# Altium footprint library IC.PcbLib: 386 footprints (part 20 of 30)
Each footprint in its own frame and in the unit in brackets; x right, y up, seen from the top. Pads: shape width x height; smd on the part's side, far side on the other; paste and mask are expansions set on the pad; w line width, h text height; cw(c..) or ccw(c..) is an arc to the next point about the centre after c.
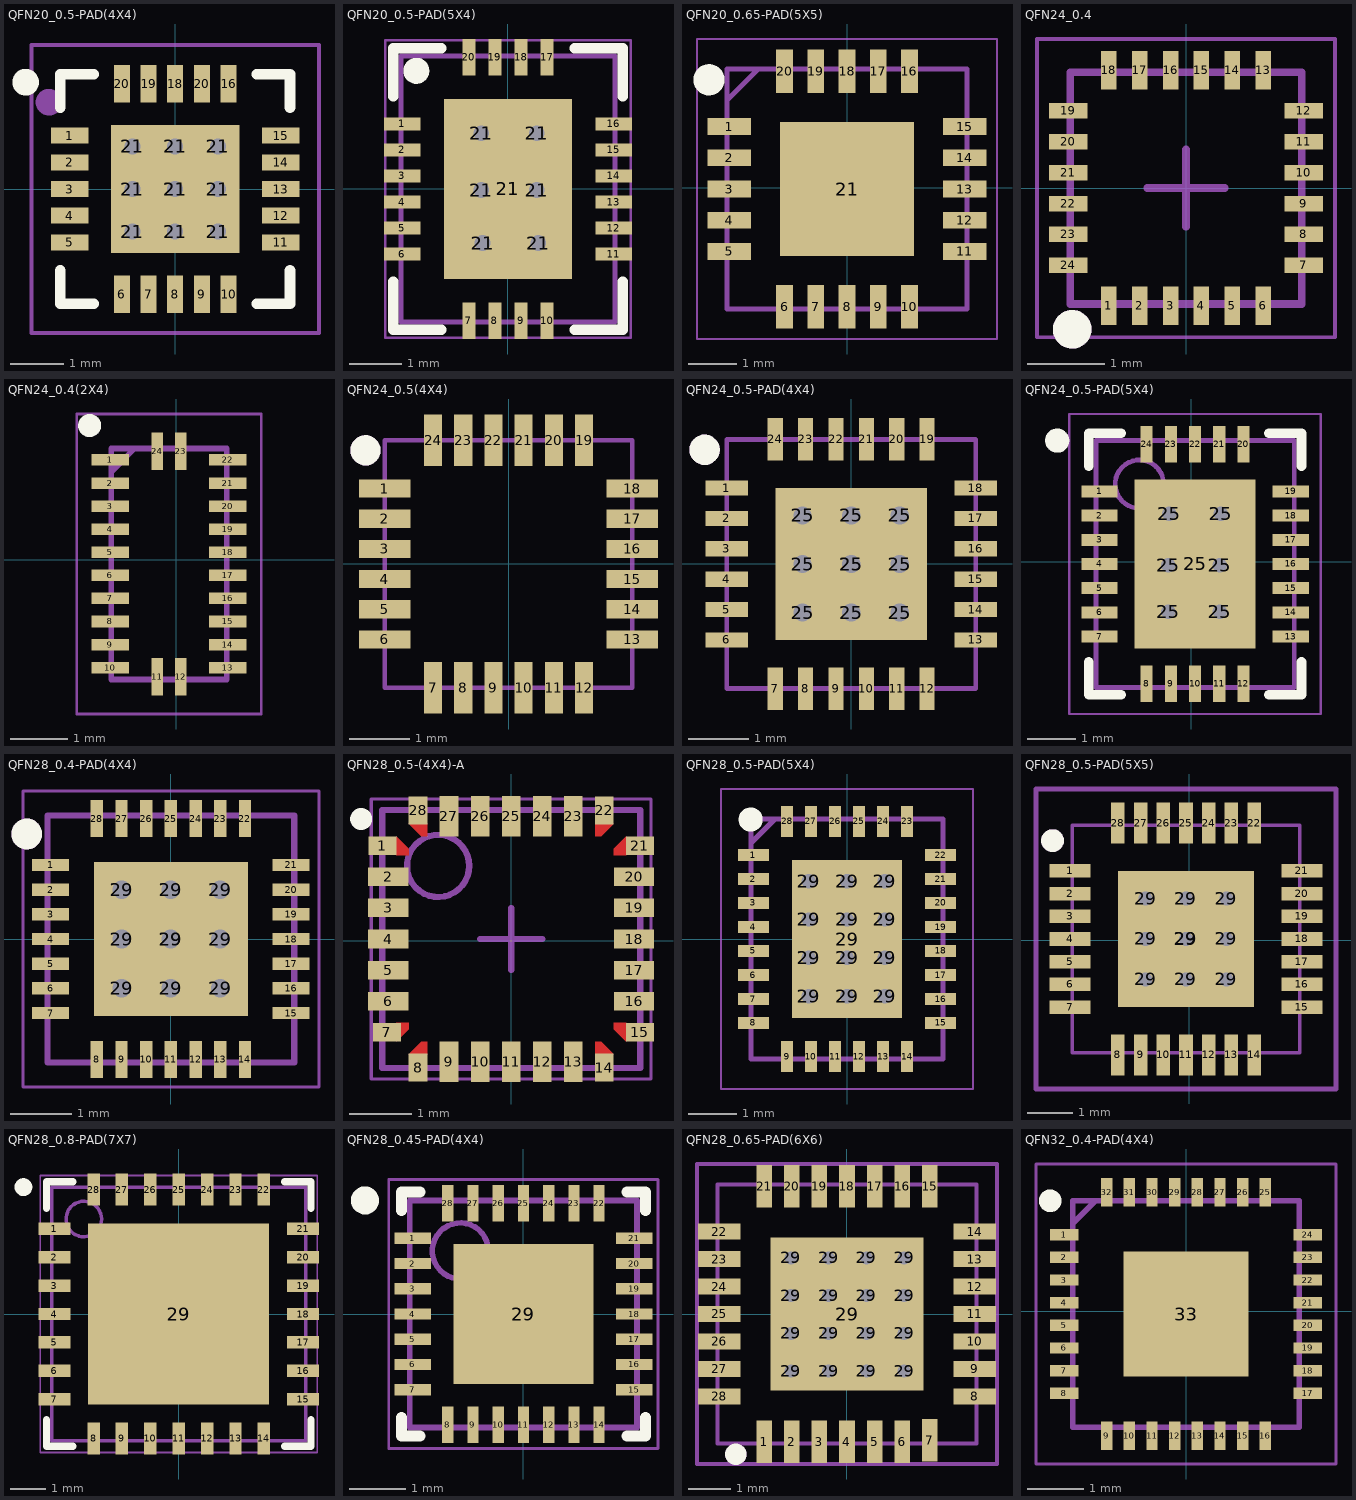
[diagram p19: the footprints below, top view; thin cyan lines are the x and y axes]

## QFN20_0.5-PAD(4X4) [mm]
pads (30):
  rect 0.7x0.3 smd paste-0.02: 1(-1.974,1) 2(-1.974,0.5) 3(-1.974,0) 4(-1.974,-0.5) 5(-1.974,-1) 11(1.974,-1) 12(1.974,-0.5) 13(1.974,0) 14(1.974,0.5) 15(1.974,1)
  rect 0.3x0.7 smd paste-0.02: 6(-1,-1.974) 7(-0.5,-1.974) 8(0,-1.974) 9(0.5,-1.974) 10(1,-1.974) 16(1,1.974) 18(0,1.974) 19(-0.5,1.974) 20(-1,1.974) 20(0.5,1.974)
  round 0.6 hole 0.3: 21(-0.8,-0.8) 21(-0.8,0) 21(-0.8,0.8) 21(0,-0.8) 21(0,0) 21(0,0.8) 21(0.8,-0.8) 21(0.8,0) 21(0.8,0.8)
  rect 2.4x2.4 smd paste-3: 21(0,0)
Top Overlay:
  circle w0.25: c-2.8,2 r0.125
  lines w0.2: -2.15,-1.525 -2.15,-2.15 -1.525,-2.15 ; -2.15,1.525 -2.15,2.15 -1.525,2.15 ; 1.525,-2.15 2.15,-2.15 2.15,-1.525 ; 1.525,2.15 2.15,2.15 2.15,1.525
Top Paste:
  region: 1.118,-0.152 0.152,-0.152 0.152,-1.118 1.118,-1.118
  rectangle: -1.118,-1.118 -0.152,-0.152
  rectangle: -1.118,0.152 -0.152,1.118
  region: 1.118,1.118 0.152,1.118 0.152,0.152 1.118,0.152
Mechanical 15:
  circle w0.25: c-2.362,1.626 r0.125
  lines w0.076: -2.692,-2.692 2.692,-2.692 2.692,2.692 -2.692,2.692 -2.692,-2.692
3D body "User Library-QFN20_4x4x0_8.step": height 0.78, standoff -0.02, extent -2.01,-2.01 2.01,2.01

## QFN20_0.5-PAD(5X4) [mm]
pads (27):
  rect 0.7x0.25 smd: 1(-2.02,1.245) 2(-2.02,0.745) 3(-2.02,0.245) 4(-2.02,-0.255) 5(-2.02,-0.755) 6(-2.02,-1.255) 11(2.031,-1.255) 12(2.031,-0.755) 13(2.031,-0.255) 14(2.031,0.245) 15(2.031,0.745) 16(2.031,1.245)
  rect 0.25x0.7 smd: 7(-0.745,-2.531) 8(-0.245,-2.531) 9(0.255,-2.531) 10(0.755,-2.531) 17(0.755,2.52) 18(0.255,2.52) 19(-0.245,2.52) 20(-0.745,2.52)
  round 0.6 hole 0.3: 21(-0.508,-0.025) 21(-0.508,1.067) 21(-0.483,-1.041) 21(0.559,-0.025) 21(0.559,1.067) 21(0.584,-1.041)
  rect 2.45x3.45 smd: 21(0.005,-0.005)
Top Overlay:
  circle w0.25: c-1.753,2.261 r0.125
  lines w0.2: -2.195,-1.78 -2.195,-2.705 -1.27,-2.705 ; -2.195,1.77 -2.195,2.695 -1.27,2.695 ; 1.28,-2.705 2.205,-2.705 2.205,-1.78 ; 1.28,2.695 2.205,2.695 2.205,1.77
Mechanical 13:
  lines w0.1: -2.045,-2.555 2.055,-2.555 2.055,2.545 -2.045,2.545 -2.045,-2.555
Mechanical 15:
  lines w0.05: -2.345,-2.855 2.355,-2.855 2.355,2.845 -2.345,2.845 -2.345,-2.855
  lines w0.1: -0.495,-0.005 0.505,-0.005 ; 0.005,-0.505 0.005,0.495
3D body: height 0.8, standoff 0, extent -2.045,-2.555 2.055,2.545
3D body: height 0.81, standoff 0.4, extent -1.778,1.859 -1.28,2.358

## QFN20_0.65-PAD(5X5) [mm]
pads (21):
  rect 0.9x0.35 smd: 1(-2.452,1.275) 2(-2.452,0.625) 3(-2.452,-0.025) 4(-2.452,-0.675) 5(-2.452,-1.325) 11(2.452,-1.325) 12(2.452,-0.675) 13(2.452,-0.025) 14(2.452,0.625) 15(2.452,1.275)
  rect 0.35x0.9 smd: 6(-1.3,-2.477) 7(-0.65,-2.477) 8(0,-2.477) 9(0.65,-2.477) 10(1.3,-2.477) 16(1.3,2.426) 17(0.65,2.426) 18(0,2.426) 19(-0.65,2.426) 20(-1.3,2.426)
  rect 2.8x2.8 smd: 21(0,-0.025)
Top Overlay:
  circle w0.325: c-2.875,2.25 r0.162
Mechanical 13:
  lines w0.1: -2.5,1.825 -1.85,2.475 ; -2.5,-2.525 -2.5,2.475 2.5,2.475 2.5,-2.525 -2.5,-2.525
Mechanical 15:
  lines w0.05: -3.125,-3.15 -3.125,3.1 3.125,3.1 3.125,-3.15 -3.125,-3.15
3D body "TPS74801RGWR.stp": height 1, standoff 0, extent -2.55,-2.575 2.55,2.525

## QFN24_0.4 [mm] "QFN, 24-Leads, Body 3.00x3.00mm, Pitch 0.40mm, Thermal Pad 1.54x1.70mm, IPC Medium Density"
height 1
pads (24):
  rect 0.2x0.5 smd mask+0.07: 1(-1,-1.525) 2(-0.6,-1.525) 3(-0.2,-1.525) 4(0.2,-1.525) 5(0.6,-1.525) 6(1,-1.525) 13(1,1.525) 14(0.6,1.525) 15(0.2,1.525) 16(-0.2,1.525) 17(-0.6,1.525) 18(-1,1.525)
  rect 0.5x0.2 smd mask+0.07: 7(1.525,-1) 8(1.525,-0.6) 9(1.525,-0.2) 10(1.525,0.2) 11(1.525,0.6) 12(1.525,1) 19(-1.525,1) 20(-1.525,0.6) 21(-1.525,0.2) 22(-1.525,-0.2) 23(-1.525,-0.6) 24(-1.525,-1)
Top Overlay:
  circle w0.25: c-1.473,-1.829 r0.125
Mechanical 15:
  circle w0.25: c-1.473,-1.829 r0.125
  lines w0.05: -1.93,-1.93 -1.93,1.93 1.93,1.93 1.93,-1.93 -1.93,-1.93
  lines w0.1: -0.5,0 0.5,0 ; 0,-0.5 0,0.5 ; -1.5,-1.5 -1.5,1.5 1.5,1.5 1.5,-1.5 -1.5,-1.5
3D body "QFN40P300X300X80-24N.step": height 0.8, standoff 0, extent -1.51,-1.485 1.51,1.535

## QFN24_0.4(2X4) [mm]
height 1
pads (24):
  rect 0.65x0.2 smd: 1(-1.143,1.727) 2(-1.143,1.327) 3(-1.143,0.927) 4(-1.143,0.527) 5(-1.143,0.127) 6(-1.143,-0.273) 7(-1.143,-0.673) 8(-1.143,-1.073) 9(-1.143,-1.473) 10(-1.143,-1.873) 13(0.889,-1.873) 14(0.889,-1.473) 15(0.889,-1.073) 16(0.889,-0.673) 17(0.889,-0.273) 18(0.889,0.127) 19(0.889,0.527) 20(0.889,0.927) 21(0.889,1.327) 22(0.889,1.727)
  rect 0.2x0.65 smd: 11(-0.327,-2.026) 12(0.073,-2.026) 23(0.073,1.874) 24(-0.327,1.874)
Top Overlay:
  circle w0.2: c-1.502,2.324 r0.1
Mechanical 13:
  lines w0.1: -1.127,1.524 -0.727,1.924 ; -1.127,-2.076 0.873,-2.076 0.873,1.924 -1.127,1.924 -1.127,-2.076
Mechanical 15:
  lines w0.05: -1.727,-2.676 1.473,-2.676 1.473,2.524 -1.727,2.524 -1.727,-2.676
3D body "TPD12S016RKTR.stp": height 0.55, standoff 0, extent -1.177,-2.126 0.923,1.974

## QFN24_0.5(4X4) [mm]
height 1.1
pads (24):
  rect 0.85x0.3 smd paste-0.03: 1(-2.05,1.25) 2(-2.05,0.75) 3(-2.05,0.25) 4(-2.05,-0.25) 5(-2.05,-0.75) 6(-2.05,-1.25) 13(2.05,-1.25) 14(2.05,-0.75) 15(2.05,-0.25) 16(2.05,0.25) 17(2.05,0.75) 18(2.05,1.25)
  rect 0.3x0.85 smd paste-0.03: 7(-1.25,-2.05) 8(-0.75,-2.05) 9(-0.25,-2.05) 10(0.25,-2.05) 11(0.75,-2.05) 12(1.25,-2.05) 19(1.25,2.05) 20(0.75,2.05) 21(0.25,2.05) 22(-0.25,2.05) 23(-0.75,2.05) 24(-1.25,2.05)
Top Overlay:
  circle w0.25: c-2.367,1.882 r0.125
Mechanical 15:
  circle w0.25: c-2.367,1.882 r0.125
  lines w0.076: -2.05,-2.05 -2.05,2.05 2.05,2.05 2.05,-2.05 -2.05,-2.05
3D body "QFN 24 4x4.STEP": height 0.9, standoff 0, extent -2.002,-2.002 2.002,2.002

## QFN24_0.5-PAD(4X4) [mm] "QFN, 24-Leads, Body 4.1x4.1mm (max), Pitch 0.50mm, IPC Medium Density"
height 1
pads (34):
  rect 0.7x0.25 smd: 1(-2.05,1.25) 2(-2.05,0.75) 3(-2.05,0.25) 4(-2.05,-0.25) 5(-2.05,-0.75) 6(-2.05,-1.25) 13(2.05,-1.25) 14(2.05,-0.75) 15(2.05,-0.25) 16(2.05,0.25) 17(2.05,0.75) 18(2.05,1.25)
  rect 0.25x0.7 smd: 7(-1.25,-2.05) 8(-0.75,-2.05) 9(-0.25,-2.05) 10(0.25,-2.05) 11(0.75,-2.05) 12(1.25,-2.05) 19(1.25,2.05) 20(0.75,2.05) 21(0.25,2.05) 22(-0.25,2.05) 23(-0.75,2.05) 24(-1.25,2.05)
  round 0.6 hole 0.3: 25(-0.8,-0.8) 25(-0.8,0) 25(-0.8,0.8) 25(0,-0.8) 25(0,0) 25(0,0.8) 25(0.8,-0.8) 25(0.8,0) 25(0.8,0.8)
  rect 2.5x2.5 smd paste-5: 25(0,0)
Top Overlay:
  circle w0.25: c-2.413,1.88 r0.125
Top Paste:
  region: -1.143,-0.15 -1.143,-1.143 -0.15,-1.143 -0.15,-0.15
  region: 0.15,-0.15 0.15,-1.143 1.143,-1.143 1.143,-0.15
  region: 1.143,0.15 1.143,1.143 0.15,1.143 0.15,0.15
  region: -0.15,0.15 -0.15,1.143 -1.143,1.143 -1.143,0.15
Mechanical 15:
  circle w0.25: c-2.413,1.88 r0.125
  lines w0.076: -2.05,-2.05 2.05,-2.05 2.05,2.05 -2.05,2.05 -2.05,-2.05
  lines w0.1: -0.5,0 0.5,0 ; 0,-0.5 0,0.5
3D body "QFN 24 4x4.STEP": height 0.9, standoff 0, extent -2.002,-2.002 2.002,2.002

## QFN24_0.5-PAD(5X4) [mm] "QFN, 24-Leads, Body 4.1x4.1mm (max), Pitch 0.50mm, IPC Medium Density"
height 1
pads (31):
  rect 0.75x0.25 smd: 1(-1.899,1.449) 2(-1.899,0.949) 3(-1.899,0.449) 4(-1.899,-0.051) 5(-1.899,-0.551) 6(-1.899,-1.051) 7(-1.899,-1.551) 13(2.051,-1.551) 14(2.051,-1.051) 15(2.051,-0.551) 16(2.051,-0.051) 17(2.051,0.449) 18(2.051,0.949) 19(2.051,1.449)
  rect 0.25x0.75 smd: 8(-0.924,-2.526) 9(-0.424,-2.526) 10(0.076,-2.526) 11(0.576,-2.526) 12(1.076,-2.526) 20(1.076,2.424) 21(0.576,2.424) 22(0.076,2.424) 23(-0.424,2.424) 24(-0.924,2.424)
  round 0.6 hole 0.3: 25(-0.483,-1.041) 25(-0.483,-0.076) 25(-0.457,0.991) 25(0.584,-1.041) 25(0.584,-0.076) 25(0.61,0.991)
  rect 2.5x3.5 smd: 25(0.076,-0.051)
Top Overlay:
  circle w0.25: c-2.774,2.499 r0.125
  lines w0.2: -2.124,-2.076 -2.124,-2.751 -1.449,-2.751 ; -2.124,1.974 -2.124,2.649 -1.449,2.649 ; 1.601,-2.751 2.276,-2.751 2.276,-2.076 ; 1.601,2.649 2.276,2.649 2.276,1.974
Mechanical 13:
  circle w0.1: c-1.074,1.599 r0.5
  lines w0.1: -1.974,-2.601 -1.974,2.499 2.126,2.499 2.126,-2.601 -1.974,-2.601
Mechanical 15:
  lines w0.05: -2.524,-3.151 -2.524,3.049 2.676,3.049 2.676,-3.151 -2.524,-3.151
  lines w0.1: -0.424,-0.051 0.576,-0.051 ; 0.076,-0.551 0.076,0.449
3D body "LTC4007.stp": height 0.8, standoff 0, extent -1.974,-2.601 2.126,2.499

## QFN28_0.4-PAD(4X4) [mm] "QFN, 24-Leads, Body 3.00x3.00mm, Pitch 0.40mm, Thermal Pad 1.54x1.70mm, IPC Medium Density"
height 1
pads (38):
  rect 0.6x0.2 smd mask+0.07: 1(-1.95,1.2) 2(-1.95,0.8) 3(-1.95,0.4) 4(-1.95,0) 5(-1.95,-0.4) 6(-1.95,-0.8) 7(-1.95,-1.2) 15(1.95,-1.2) 16(1.95,-0.8) 17(1.95,-0.4) 18(1.95,0) 19(1.95,0.4) 20(1.95,0.8) 21(1.95,1.2)
  rect 0.2x0.6 smd mask+0.07: 8(-1.2,-1.95) 9(-0.8,-1.95) 10(-0.4,-1.95) 11(0,-1.95) 12(0.4,-1.95) 13(0.8,-1.95) 14(1.2,-1.95) 22(1.2,1.95) 23(0.8,1.95) 24(0.4,1.95) 25(0,1.95) 26(-0.4,1.95) 27(-0.8,1.95) 28(-1.2,1.95)
  round 0.6 hole 0.3: 29(-0.8,-0.8) 29(-0.8,0) 29(-0.8,0.8) 29(0,-0.8) 29(0,0) 29(0,0.8) 29(0.8,-0.8) 29(0.8,0) 29(0.8,0.8)
  rect 2.5x2.5 smd paste-5: 29(0,0)
Top Overlay:
  circle w0.25: c-2.337,1.702 r0.125
Top Paste:
  region: -1.143,-0.15 -1.143,-1.143 -0.15,-1.143 -0.15,-0.15
  region: 0.15,-0.15 0.15,-1.143 1.143,-1.143 1.143,-0.15
  region: 1.143,0.15 1.143,1.143 0.15,1.143 0.15,0.15
  region: -0.15,0.15 -0.15,1.143 -1.143,1.143 -1.143,0.15
Mechanical 15:
  circle w0.25: c-2.337,1.702 r0.125
  lines w0.05: -2.4,-2.4 2.4,-2.4 2.4,2.4 -2.4,2.4 -2.4,-2.4
  lines w0.1: -0.5,0 0.5,0 ; 0,-0.5 0,0.5 ; -2,-2 2,-2 2,2 -2,2 -2,-2
3D body "QFN28-0.4mm-4X4.STEP": height 0.75, standoff 0, extent -2,-2 2,2

## QFN28_0.5-(4X4)-A [mm]
height 1
pads (28):
  rect 0.45x0.3 smd paste+0 mask-0.15: 1(-2.07,1.524) 7(-2,-1.475) 15(2.07,-1.473) 21(2.07,1.524)
  rect 0.65x0.3 smd paste+0 mask+0.06: 2(-1.977,1.025) 3(-1.977,0.525) 4(-1.977,0.025) 5(-1.977,-0.475) 6(-1.977,-0.975) 16(1.977,-0.975) 17(1.977,-0.475) 18(1.977,0.025) 19(1.977,0.525) 20(1.977,1.025)
  rect 0.3x0.45 smd paste+0 mask-0.15: 8(-1.499,-2.045) 14(1.499,-2.045) 22(1.499,2.095) 28(-1.499,2.095)
  rect 0.3x0.65 smd paste+0 mask+0.06: 9(-1,-1.951) 10(-0.5,-1.951) 11(0,-1.951) 12(0.5,-1.951) 13(1,-1.951) 23(1,2.002) 24(0.5,2.002) 25(0,2.002) 26(-0.5,2.002) 27(-1,2.002)
Top Layer:
  region: 1.65,-1.325 1.85,-1.325 1.85,-1.625 1.65,-1.425
  region: -1.35,-1.625 -1.35,-1.825 -1.65,-1.825 -1.45,-1.625
  region: -1.65,-1.325 -1.85,-1.325 -1.85,-1.625 -1.65,-1.425
  region: 1.65,1.375 1.85,1.375 1.85,1.675 1.65,1.475
  region: 1.35,-1.625 1.35,-1.825 1.65,-1.825 1.45,-1.625
  region: 1.35,1.675 1.35,1.875 1.65,1.875 1.45,1.675
  region: -1.35,1.675 -1.35,1.875 -1.65,1.875 -1.45,1.675
  region: -1.35,-1.625 -1.35,-1.825 -1.65,-1.825 -1.45,-1.625
  region: -1.65,1.375 -1.85,1.375 -1.85,1.675 -1.65,1.475
Top Overlay:
  circle w0.25: c-2.413,1.956 r0.051
Top Paste:
  region: -1.65,1.375 -1.85,1.375 -1.85,1.675 -1.65,1.475
  region: -1.35,-1.625 -1.35,-1.825 -1.65,-1.825 -1.45,-1.625
  region: 1.35,-1.625 1.35,-1.825 1.65,-1.825 1.45,-1.625
  region: 1.65,1.375 1.85,1.375 1.85,1.675 1.65,1.475
  region: -1.35,1.675 -1.35,1.875 -1.65,1.875 -1.45,1.675
  region: -1.65,-1.325 -1.85,-1.325 -1.85,-1.625 -1.65,-1.425
  region: 1.65,-1.325 1.85,-1.325 1.85,-1.625 1.65,-1.425
  region: 1.35,1.675 1.35,1.875 1.65,1.875 1.45,1.675
Top Solder:
  region: -1.825,1.735 -2.362,1.735 -2.362,1.315 -1.59,1.315 -1.59,1.5
  region: -1.71,-1.8 -1.71,-2.337 -1.29,-2.337 -1.29,-1.565 -1.475,-1.565
  region: 1.71,-1.8 1.71,-2.337 1.29,-2.337 1.29,-1.565 1.475,-1.565
  region: 1.825,1.735 2.349,1.735 2.349,1.315 1.59,1.315 1.59,1.5
  region: -1.71,1.851 -1.71,2.388 -1.29,2.388 -1.29,1.615 -1.475,1.616
  region: -1.825,-1.685 -2.362,-1.685 -2.362,-1.265 -1.59,-1.265 -1.59,-1.449
  region: 1.825,-1.685 2.362,-1.685 2.362,-1.265 1.59,-1.265 1.59,-1.449
  region: 1.71,1.851 1.71,2.388 1.29,2.388 1.29,1.615 1.475,1.616
Mechanical 13:
  circle w0.1: c-1.175,1.2 r0.5
  lines w0.1: -2.075,-2.05 2.075,-2.05 2.075,2.1 -2.075,2.1 -2.075,-2.05
Mechanical 15:
  lines w0.05: -2.25,-2.225 2.25,-2.225 2.25,2.275 -2.25,2.275 -2.25,-2.225
  lines w0.1: -0.5,0.025 0.5,0.025 ; 0,-0.475 0,0.525
3D body: height 0.6, standoff 0, extent -2.075,-2.05 2.075,2.1
3D body: height 0.61, standoff 0.4, extent -1.696,1.198 -1.198,1.697

## QFN28_0.5-PAD(5X4) [mm]
pads (41):
  rect 0.65x0.25 smd: 1(-1.95,1.75) 2(-1.95,1.25) 3(-1.95,0.75) 4(-1.95,0.25) 5(-1.95,-0.25) 6(-1.95,-0.75) 7(-1.95,-1.25) 8(-1.95,-1.75) 15(1.95,-1.75) 16(1.95,-1.25) 17(1.95,-0.75) 18(1.95,-0.25) 19(1.95,0.25) 20(1.95,0.75) 21(1.95,1.25) 22(1.95,1.75)
  rect 0.25x0.65 smd: 9(-1.25,-2.45) 10(-0.75,-2.45) 11(-0.25,-2.45) 12(0.25,-2.45) 13(0.75,-2.45) 14(1.25,-2.45) 23(1.25,2.45) 24(0.75,2.45) 25(0.25,2.45) 26(-0.25,2.45) 27(-0.75,2.45) 28(-1.25,2.45)
  round 0.6 hole 0.3: 29(-0.8,-1.194) 29(-0.8,-0.394) 29(-0.8,0.406) 29(-0.8,1.206) 29(0,-1.194) 29(0,-0.394) 29(0,0.406) 29(0,1.206) 29(0.787,-1.194) 29(0.787,-0.394) 29(0.787,0.406) 29(0.787,1.206)
  rect 2.3x3.3 smd: 29(0,0)
Top Overlay:
  circle w0.25: c-2.007,2.489 r0.125
Mechanical 13:
  lines w0.1: -2,2 -1.5,2.5 ; -2,-2.5 2,-2.5 2,2.5 -2,2.5 -2,-2.5
Mechanical 15:
  lines w0.05: -2.625,-3.125 2.625,-3.125 2.625,3.125 -2.625,3.125 -2.625,-3.125
3D body "LTC4155EUFD#PBF.stp": height 0.8, standoff 0, extent -2.05,-2.55 2.05,2.55

## QFN28_0.5-PAD(5X5) [mm] "QFN, 28-Leads, Body 5.0x5.0mm (max), Pitch 0.50mm, IPC Low Density"
height 1
pads (38):
  rect 0.9x0.3 smd: 1(-2.626,1.525) 2(-2.626,1.025) 3(-2.626,0.525) 4(-2.626,0.025) 5(-2.626,-0.475) 6(-2.626,-0.975) 7(-2.626,-1.475) 15(2.474,-1.475) 16(2.474,-0.975) 17(2.474,-0.475) 18(2.474,0.025) 19(2.474,0.525) 20(2.474,1.025) 21(2.474,1.525)
  rect 0.3x0.9 smd: 8(-1.576,-2.525) 9(-1.076,-2.525) 10(-0.576,-2.525) 11(-0.076,-2.525) 12(0.424,-2.525) 13(0.924,-2.525) 14(1.424,-2.525) 22(1.424,2.575) 23(0.924,2.575) 24(0.424,2.575) 25(-0.076,2.575) 26(-0.576,2.575) 27(-1.076,2.575) 28(-1.576,2.575)
  round 0.61 hole 0.305: 29(-0.965,-0.864) 29(-0.965,0.025) 29(-0.965,0.914) 29(-0.076,-0.864) 29(-0.076,0.025) 29(-0.076,0.914) 29(0.813,-0.864) 29(0.813,0.025) 29(0.813,0.914)
  rect 3x3 smd paste-3: 29(-0.076,0.025)
Top Overlay:
  circle w0.25: c-3.013,2.191 r0.125
Top Paste:
  region: 0.074,-0.125 0.074,-1.425 1.374,-1.425 1.374,-0.125
  region: -0.226,-0.125 -1.526,-0.125 -1.526,-1.425 -0.226,-1.425
  region: -0.226,0.175 -0.226,1.475 -1.526,1.475 -1.526,0.175
  rectangle: 0.074,0.175 1.374,1.475
Mechanical 15:
  circle w0.25: c-3.013,2.191 r0.125
  lines w0.076: -2.576,-2.475 2.424,-2.475 2.424,2.525 -2.576,2.525 -2.576,-2.475
  lines w0.1: -0.576,0.025 0.424,0.025 ; -0.076,-0.475 -0.076,0.525 ; -3.378,-3.277 -3.378,3.327 3.226,3.327 3.226,-3.277 -3.378,-3.277
3D body "QFN28-5X5.STEP": height 1, standoff 0, extent -2.576,-2.475 2.424,2.525

## QFN28_0.8-PAD(7X7) [mm]
height 1.1
pads (29):
  rect 0.9x0.35 smd: 1(-3.502,2.4) 2(-3.502,1.6) 3(-3.502,0.8) 4(-3.502,0) 5(-3.502,-0.8) 6(-3.502,-1.6) 7(-3.502,-2.4) 15(3.502,-2.4) 16(3.502,-1.6) 17(3.502,-0.8) 18(3.502,0) 19(3.502,0.8) 20(3.502,1.6) 21(3.502,2.4)
  rect 0.35x0.9 smd: 8(-2.4,-3.502) 9(-1.6,-3.502) 10(-0.8,-3.502) 11(0,-3.502) 12(0.8,-3.502) 13(1.6,-3.502) 14(2.4,-3.502) 22(2.4,3.502) 23(1.6,3.502) 24(0.8,3.502) 25(0,3.502) 26(-0.8,3.502) 27(-1.6,3.502) 28(-2.4,3.502)
  rect 5.1x5.1 smd: 29(0,0)
Top Overlay:
  circle w0.25: c-4.375,3.575 r0.125
  lines w0.2: -3.725,-2.975 -3.725,-3.725 -2.975,-3.725 ; -3.725,2.975 -3.725,3.725 -2.975,3.725 ; 2.975,-3.725 3.725,-3.725 3.725,-2.975 ; 2.975,3.725 3.725,3.725 3.725,2.975
Mechanical 13:
  circle w0.1: c-2.675,2.675 r0.5
  lines w0.1: -3.575,-3.575 -3.575,3.575 3.575,3.575 3.575,-3.575 -3.575,-3.575
Mechanical 15:
  lines w0.05: -3.9,-3.9 -3.9,3.9 3.9,3.9 3.9,-3.9 -3.9,-3.9
  lines w0.1: -0.5,0 0.5,0 ; 0,-0.5 0,0.5
3D body "QFN80P700X700X80_HS-29N.step": height 0.8, standoff 0, extent -3.51,-3.459 3.51,3.561

## QFN28_0.45-PAD(4X4) [mm]
height 1
pads (29):
  rect 0.65x0.2 smd: 1(-1.975,1.35) 2(-1.975,0.9) 3(-1.975,0.45) 4(-1.975,0) 5(-1.975,-0.45) 6(-1.975,-0.9) 7(-1.975,-1.35) 15(1.975,-1.35) 16(1.975,-0.9) 17(1.975,-0.45) 18(1.975,0) 19(1.975,0.45) 20(1.975,0.9) 21(1.975,1.35)
  rect 0.2x0.65 smd: 8(-1.35,-1.975) 9(-0.9,-1.975) 10(-0.45,-1.975) 11(0,-1.975) 12(0.45,-1.975) 13(0.9,-1.975) 14(1.35,-1.975) 22(1.35,1.975) 23(0.9,1.975) 24(0.45,1.975) 25(0,1.975) 26(-0.45,1.975) 27(-0.9,1.975) 28(-1.35,1.975)
  rect 2.5x2.5 smd: 29(0,0)
Top Overlay:
  circle w0.25: c-2.825,2.025 r0.125
  lines w0.2: -2.175,-1.85 -2.175,-2.175 -1.85,-2.175 ; -2.175,1.85 -2.175,2.175 -1.85,2.175 ; 1.85,-2.175 2.175,-2.175 2.175,-1.85 ; 1.85,2.175 2.175,2.175 2.175,1.85
Mechanical 13:
  circle w0.1: c-1.125,1.125 r0.5
  lines w0.1: -2.025,-2.025 -2.025,2.025 2.025,2.025 2.025,-2.025 -2.025,-2.025
Mechanical 15:
  lines w0.05: -2.4,-2.4 -2.4,2.4 2.4,2.4 2.4,-2.4 -2.4,-2.4
  lines w0.1: -0.5,0 0.5,0 ; 0,-0.5 0,0.5
3D body "QFN45P400X400X80_HS-29N.step": height 0.8, standoff 0, extent -2.01,-2.01 2.01,2.01

## QFN28_0.65-PAD(6X6) [mil]
height 43.31
pads (45):
  rect 14.57x39.37 smd: 1(-76.77,-118.2) 2(-51.18,-118.2) 3(-25.59,-118.2) 4(0,-118.2) 5(25.59,-118.2) 6(51.18,-118.2) 7(76.77,-117.2) 15(76.77,118.2) 16(51.18,118.2) 17(25.59,118.2) 18(0,118.2) 19(-25.59,118.2) 20(-51.18,118.2) 21(-76.77,118.2)
  rect 39.37x14.57 smd: 8(118.6,-76.38) 9(118.6,-50.92) 10(118.6,-25.46) 11(118.6,0) 12(118.6,25.46) 13(118.6,50.92) 14(118.6,76.38) 22(-118.6,76.38) 23(-118.6,50.92) 24(-118.6,25.46) 25(-118.6,0) 26(-118.6,-25.46) 27(-118.6,-50.92) 28(-118.6,-76.38)
  round 24 hole 12: 29(-52,-53) 29(-52,-18) 29(-52,17) 29(-52,52) 29(-17,-53) 29(-17,-18) 29(-17,17) 29(-17,52) 29(18,-53) 29(18,-18) 29(18,17) 29(18,52) 29(53,-53) 29(53,-18) 29(53,17) 29(53,52)
  rect 141.73x141.73 smd paste-196.85: 29(0,0)
Top Overlay:
  circle w9.84: c-103,-130 r4.92
Top Paste:
  rectangle: 5.91,5.91 64.96,64.96
  region: 5.91,-5.91 5.91,-64.96 64.96,-64.96 64.96,-5.91
  region: -5.91,-5.91 -64.96,-5.91 -64.96,-64.96 -5.91,-64.96
  region: -5.91,5.91 -5.91,64.96 -64.96,64.96 -64.96,5.91
Mechanical 15:
  circle w9.84: c-103,-130 r4.92
  lines w3.94: -19.68,0 19.69,0 ; 0,-19.68 0,19.69 ; -139,-139 -139,139 139,139 139,-139 -139,-139 ; -120.08,-120.08 -120.08,120.08 120.08,120.08 120.08,-120.08 -120.08,-120.08
3D body "User Library-QFN-28.STEP": height 40.26, standoff -3.3, extent -118.11,-118.11 118.11,118.11

## QFN32_0.4-PAD(4X4) [mm] "QFN, 32-Leads, Body 5.2x5.2mm (max), Pitch 0.50mm, IPC Medium Density"
height 1
pads (33):
  rect 0.5x0.2 smd: 1(-2.15,1.349) 2(-2.15,0.949) 3(-2.15,0.549) 4(-2.15,0.149) 5(-2.15,-0.251) 6(-2.15,-0.651) 7(-2.15,-1.051) 8(-2.15,-1.451) 17(2.15,-1.451) 18(2.15,-1.051) 19(2.15,-0.651) 20(2.15,-0.251) 21(2.15,0.149) 22(2.15,0.549) 23(2.15,0.949) 24(2.15,1.349)
  rect 0.2x0.5 smd: 9(-1.4,-2.201) 10(-1,-2.201) 11(-0.6,-2.201) 12(-0.2,-2.201) 13(0.2,-2.201) 14(0.6,-2.201) 15(1,-2.201) 16(1.4,-2.201) 25(1.4,2.099) 26(1,2.099) 27(0.6,2.099) 28(0.2,2.099) 29(-0.2,2.099) 30(-0.6,2.099) 31(-1,2.099) 32(-1.4,2.099)
  rect 2.2x2.2 smd: 33(0,-0.051)
Top Overlay:
  circle w0.2: c-2.4,1.949 r0.1
Mechanical 13:
  lines w0.1: -2,1.549 -1.6,1.949 ; -2,-2.051 -2,1.949 2,1.949 2,-2.051 -2,-2.051
Mechanical 15:
  lines w0.05: -2.65,-2.701 -2.65,2.599 2.65,2.599 2.65,-2.701 -2.65,-2.701
3D body "BQ40Z50RSMT-R1.stp": height 1, standoff 0, extent -2.05,-2.101 2.05,1.999